# Altium footprint library Footprints.PcbLib: 158 footprints (part 3 of 10)
Each footprint in its own frame and in the unit in brackets; x right, y up, seen from the top. Pads: shape width x height; smd on the part's side, far side on the other; paste and mask are expansions set on the pad; w line width, h text height; cw(c..) or ccw(c..) is an arc to the next point about the centre after c.
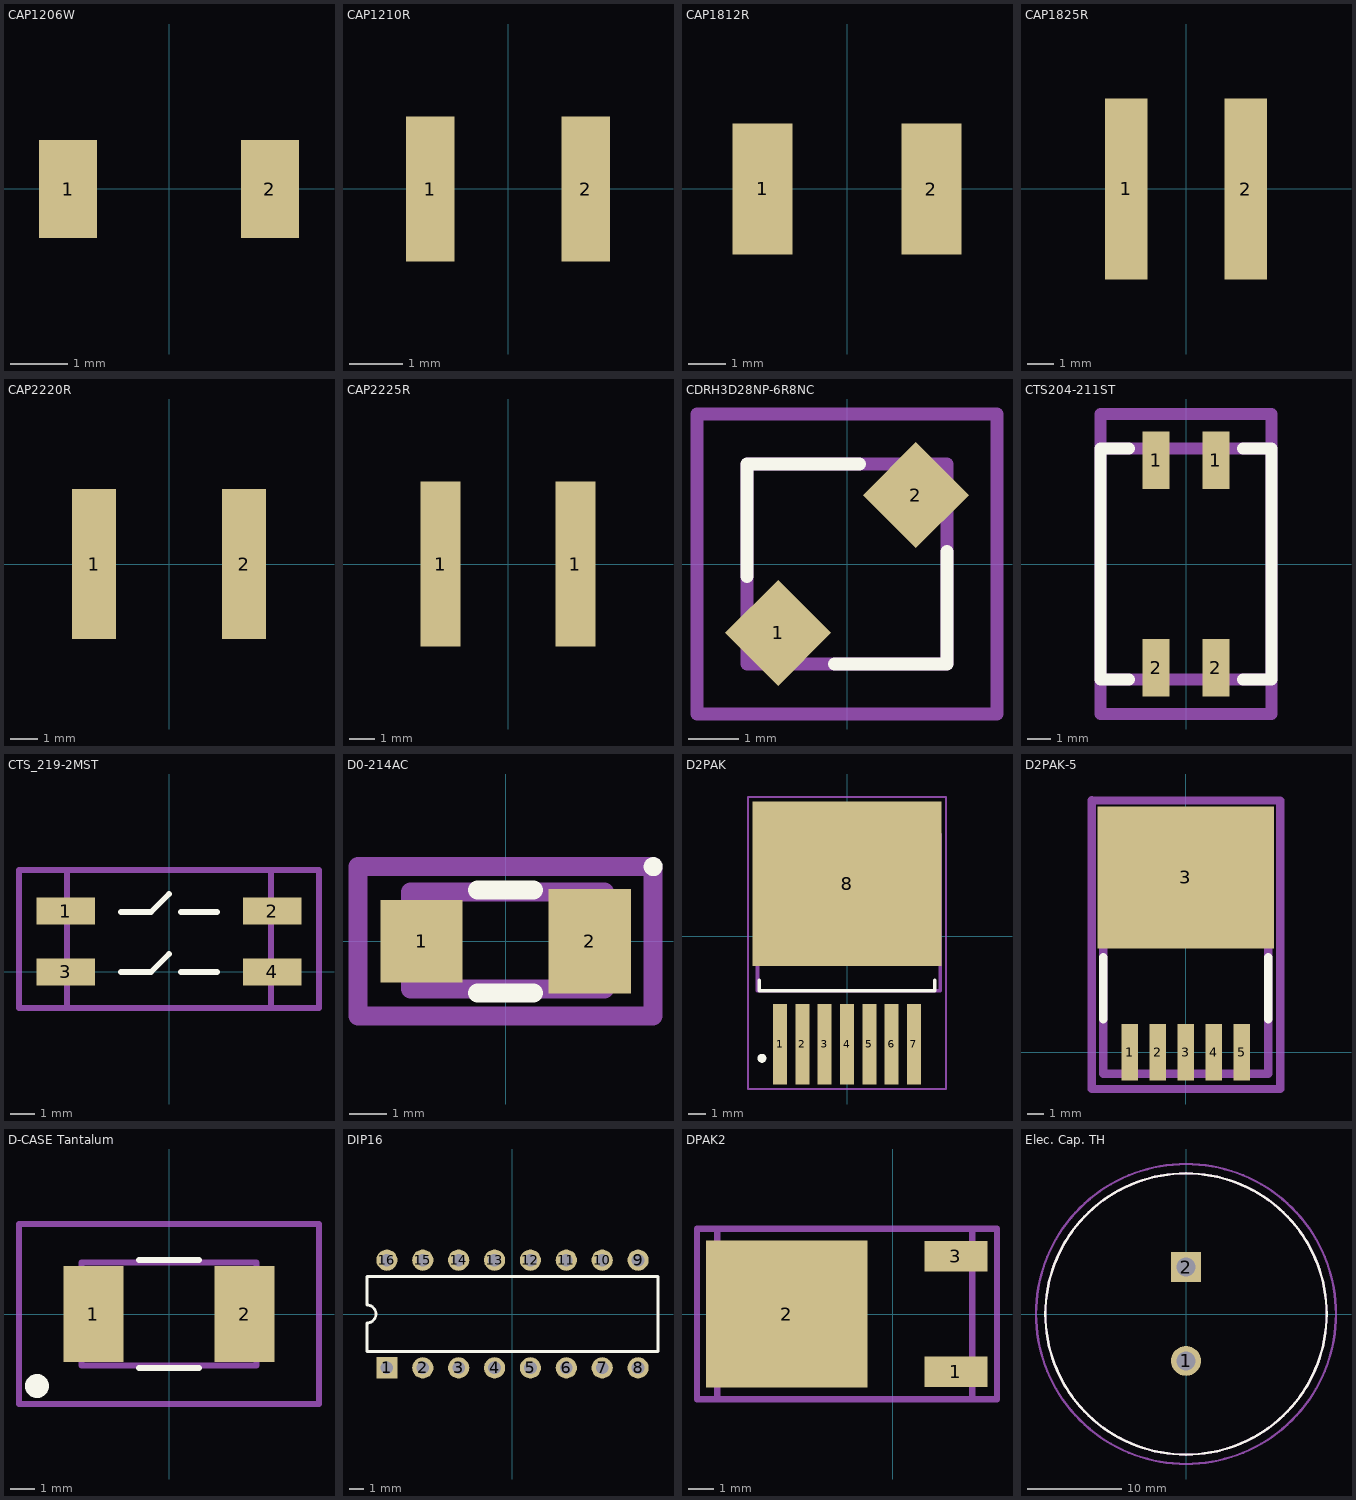
[diagram p2: the footprints below, top view; thin cyan lines are the x and y axes]

## CAP1206W [mm] "capacitor 1206 wave soldering"
pads (2):
  rect 1x1.7 smd: 1(-1.75,0) 2(1.75,0)
3D body: height 1, standoff 0, extent -1.6,-0.8 1.6,0.8

## CAP1210R [mm] "capacitor 1210 reflow soldering"
pads (2):
  rect 0.9x2.7 smd: 1(-1.45,0) 2(1.45,0)
3D body: height 0.92, standoff -0.02, extent -1.6,-1.25 1.6,1.25

## CAP1812R [mm] "capacitor 1812 reflow soldering"
pads (2):
  rect 1.6x3.5 smd: 1(-2.25,0) 2(2.25,0)
3D body: height 1.6, standoff 0, extent -2.25,-1.6 2.25,1.6

## CAP1825R [mm] "capacitor 1825 reflow soldering"
pads (2):
  rect 1.6x6.8 smd: 1(-2.25,0) 2(2.25,0)
3D body: height 1.22, standoff -0.02, extent -2.25,-3.2 2.25,3.2

## CAP2220R [mm] "capacitor 2220 reflow soldering"
pads (2):
  rect 1.6x5.4 smd: 1(-2.7,0) 2(2.7,0)
3D body: height 2.24, standoff -0.04, extent -2.85,-2.5 2.85,2.5

## CAP2225R [mm] "capacitor 2225 reflow soldering"
pads (2):
  rect 1.6x6.6 smd: 1(-2.7,0) 1(2.7,0)
3D body: height 1.44, standoff -0.04, extent -2.85,-3.175 2.87,3.175

## CDRH3D28NP-6R8NC [mm]
height 3
pads (2):
  rect 1.5x1.5 smd rot 45: 1(-1.379,-1.379) 2(1.379,1.379)
Top Overlay:
  lines w0.254: -2,-0.25 -2,2 0.25,2 ; -0.25,-2 2,-2 2,0.25
Mechanical 13:
  lines w0.254: -2,-2 2,-2 2,2 -2,2 -2,-2
Mechanical 15:
  lines w0.254: -3,-3 3,-3 3,3 -3,3 -3,-3
3D body: height 3, standoff 0, extent -2,-2 2,2

## CTS204-211ST [mm] "SPST DIP Switch"
height 7.6
pads (4):
  rect 1.13x2.435 smd mask+0.102: 1(-1.27,4.401) 1(1.27,4.401) 2(-1.27,-4.401) 2(1.27,-4.401)
Top Overlay:
  lines w0.508: -2.413,-4.89 -3.63,-4.89 -3.63,4.89 -2.413,4.89 ; 2.413,-4.89 3.63,-4.89 3.63,4.89 2.413,4.89
Mechanical 13:
  lines w0.508: -3.63,-4.89 3.63,-4.89 3.63,4.89 -3.63,4.89 -3.63,-4.89
Mechanical 15:
  lines w0.508: -3.63,-6.357 3.63,-6.357 3.63,6.357 -3.63,6.357 -3.63,-6.357
3D body: height 10.14, standoff 0, extent -3.63,-5.207 3.63,5.193

## CTS_219-2MST [mm] "2 Pos Microswitch"
height 3.8
pads (4):
  rect 2.44x1.13 smd mask+0.102: 1(-4.3,2.54) 2(4.3,2.54) 3(-4.3,0) 4(4.3,0)
Top Overlay:
  lines w0.254: -2,0 -0.75,0 0,0.75 ; -2,2.5 -1.25,2.5 -0.75,2.5 0,3.25 ; 0.5,0 2,0 ; 0.5,2.5 2,2.5
Mechanical 13:
  lines w0.254: -4.25,-1.5 4.25,-1.5 4.25,4.25 -4.25,4.25 -4.25,-1.5
Mechanical 15:
  lines w0.254: -6.25,-1.5 6.25,-1.5 6.25,4.25 -6.25,4.25 -6.25,-1.5
3D body: height 0.5, standoff 0, extent 4.25,2 5,3
3D body: height 0.5, standoff 0, extent 4.25,-0.5 5,0.5
3D body: height 0.5, standoff 0, extent -5,-0.5 -4.25,0.5
3D body: height 0.5, standoff 0, extent -5,2 -4.25,3
3D body: height 3.9, standoff 0, extent -1.25,-0.5 1.25,0.5
3D body: height 3.9, standoff 0, extent -1.25,2 1.25,3
3D body: height 3.8, standoff 0, extent -4.25,-1.5 4.25,4.25

## D0-214AC [mm]
height 2.3
pads (2):
  rect 2.2x2.21 smd mask+0.102: 1(-2.25,0)
  rect 2.2x2.8 smd mask+0.102: 2(2.25,0)
Top Overlay:
  circle w0.254: c3.95,2 r0.127
  lines w0.508: -0.75,-1.375 0.75,-1.375 ; -0.75,1.375 0.75,1.375
Mechanical 13:
  lines w0.508: -2.55,-1.275 -2.55,1.325 2.65,1.325 2.65,-1.275 -2.55,-1.275
Mechanical 15:
  lines w0.508: -3.95,-2 3.95,-2 3.95,2 -3.95,2 -3.95,-2
3D body: height 1, standoff -1.4, extent -2.55,-1.275 2.65,1.325

## D2PAK [mm] "T0-263AC-7"
height 12.7
pads (8):
  rect 0.8x4.6 smd: 1(-3.81,-6.15) 2(-2.54,-6.15) 3(-1.27,-6.15) 4(0,-6.15) 5(1.27,-6.15) 6(2.54,-6.15) 7(3.81,-6.15)
  rect 10.8x9.4 smd paste-10.492: 8(0,3)
Top Overlay:
  circle w0.254: c-4.85,-6.95 r0.127
  lines w0.203: -5,-2.5 -5,-3.099 5,-3.099 5,-2.5
Top Paste:
  rectangle: -5.3,3.4 -2.4,5.1
  rectangle: 2.4,3.4 5.3,5.1
  rectangle: -1.6,3.4 1.6,5.1
  rectangle: -1.6,5.9 1.6,7.6
  rectangle: 2.4,5.9 5.3,7.6
  rectangle: -5.3,5.9 -2.4,7.6
  rectangle: -1.6,0.9 1.6,2.6
  rectangle: 2.4,0.9 5.3,2.6
  rectangle: -5.3,0.9 -2.4,2.6
  rectangle: -5.3,-1.6 -2.4,0.1
  rectangle: 2.4,-1.6 5.3,0.1
  rectangle: -1.6,-1.6 1.6,0.1
Mechanical 13:
  lines w0.203: -5.1,-3.099 -5.1,5.817 5.309,5.817 5.309,-3.099 -5.1,-3.099
Mechanical 15:
  lines w0.102: -0.508,0 0.508,0 ; 0,-0.508 0,0.508 ; -5.65,-8.7 -5.65,7.95 5.65,7.95 5.65,-8.7 -5.65,-8.7
3D body: height 4.53, standoff 0.03, extent -5.08,-7.807 5.135,7.299

## D2PAK-5 [mm]
height 4.83
pads (6):
  rect 1x3.4 smd mask+0.102: 1(-3.4,0) 2(-1.7,0) 3(0,0) 4(1.7,0) 5(3.4,0)
  rect 10.7x8.6 smd mask+0.102: 3(0,10.6)
Top Overlay:
  lines w0.508: -5,2 -5,5.75 ; 5,2 5,5.75
Mechanical 13:
  lines w0.508: -5,14.375 -5,-1.3 5,-1.3 5,14.4 -5,14.4
Mechanical 15:
  lines w0.508: -5.7,15.275 -5.7,-2.225 5.725,-2.225 5.725,15.25 -5.675,15.25
3D body: height 4.78, standoff -0.02, extent -5,-1.29 5,14.38

## D-CASE Tantalum [mm]
height 2.8
pads (2):
  rect 2.5x4 smd: 1(-3.15,0) 2(3.15,0)
Top Overlay:
  circle w0.5: c-5.5,-3 r0.25
  lines w0.254: -1.25,-2.25 1.25,-2.25 ; -1.25,2.25 1.25,2.25
Mechanical 13:
  lines w0.254: -3.65,-2.15 -3.65,2.15 3.65,2.15 3.65,-2.15 -3.65,-2.15
Mechanical 15:
  lines w0.254: -6.25,-3.75 6.25,-3.75 6.25,3.75 -6.25,3.75 -6.25,-3.75
3D body: height 2.8, standoff 0, extent -3.65,-2.15 3.65,2.15
3D body: height 1, standoff 0, extent 3.475,-1.2 3.725,1.2
3D body: height 1, standoff 0, extent -3.725,-1.2 -3.475,1.2
3D body: height 2.81, standoff 0, extent -3.4,-1.9 -2.9,1.9

## DIP16 [mm] "DIP; 16 Leads; Row Spacing 7.62 mm; Pitch 2.54 mm"
height 5.08
pads (16):
  rect 1.5x1.5 hole 0.9: 1(-8.89,-3.81)
  round 1.5 hole 0.9: 2(-6.35,-3.81) 3(-3.81,-3.81) 4(-1.27,-3.81) 5(1.27,-3.81) 6(3.81,-3.81) 7(6.35,-3.81) 8(8.89,-3.81) 9(8.89,3.81) 10(6.35,3.81) 11(3.81,3.81) 12(1.27,3.81) 13(-1.27,3.81) 14(-3.81,3.81) 15(-6.35,3.81) 16(-8.89,3.81)
Top Overlay:
  lines w0.2: -10.3,-2.65 10.3,-2.65 10.3,2.65 -10.3,2.65 -10.3,0.635 cw(c-10.3,0) -10.3,-0.635 -10.3,-2.65
3D body: height 5.08, standoff -2.49, extent -10,-3.935 10,3.935

## DPAK2 [mm]
height 2.3
pads (3):
  rect 2.5x1.2 smd mask+0.102: 1(2.5,-2.28) 3(2.5,2.28)
  rect 6.4x5.8 smd mask+0.102: 2(-4.2,0)
Mechanical 13:
  lines w0.254: -6.95,-3.375 3.15,-3.375 3.15,3.375 -6.95,3.375 -6.95,-3.375
Mechanical 15:
  lines w0.254: -7.75,-3.375 -7.75,3.375 4.125,3.375 4.125,-3.375 -7.75,-3.375
3D body: height 2.37, standoff -0.03, extent -6.95,-3.367 3.15,3.367

## Elec. Cap. TH [mm] "THrough-hole (D=30mm, L=25mm, LS=10mm)"
pads (2):
  round 3.2 hole 2 mask+0.102: 1(0,-5)
  rect 3.2x3.2 hole 2 mask+0.102: 2(0,5)
Top Overlay:
  circle w0.254: c0,0 r15
Mechanical 13:
  circle w0.254: c0,0 r15
Mechanical 15:
  circle w0.254: c0,0 r16
3D body: height 17, standoff 0, extent -14.882,-14.97 15,14.971